# Altium footprint library Package_DFN_QFN.PcbLib: 557 footprints (part 15 of 35)
Each footprint in its own frame and in the unit in brackets; x right, y up, seen from the top. Pads: shape width x height; smd on the part's side, far side on the other; paste and mask are expansions set on the pad; w line width, h text height; cw(c..) or ccw(c..) is an arc to the next point about the centre after c.
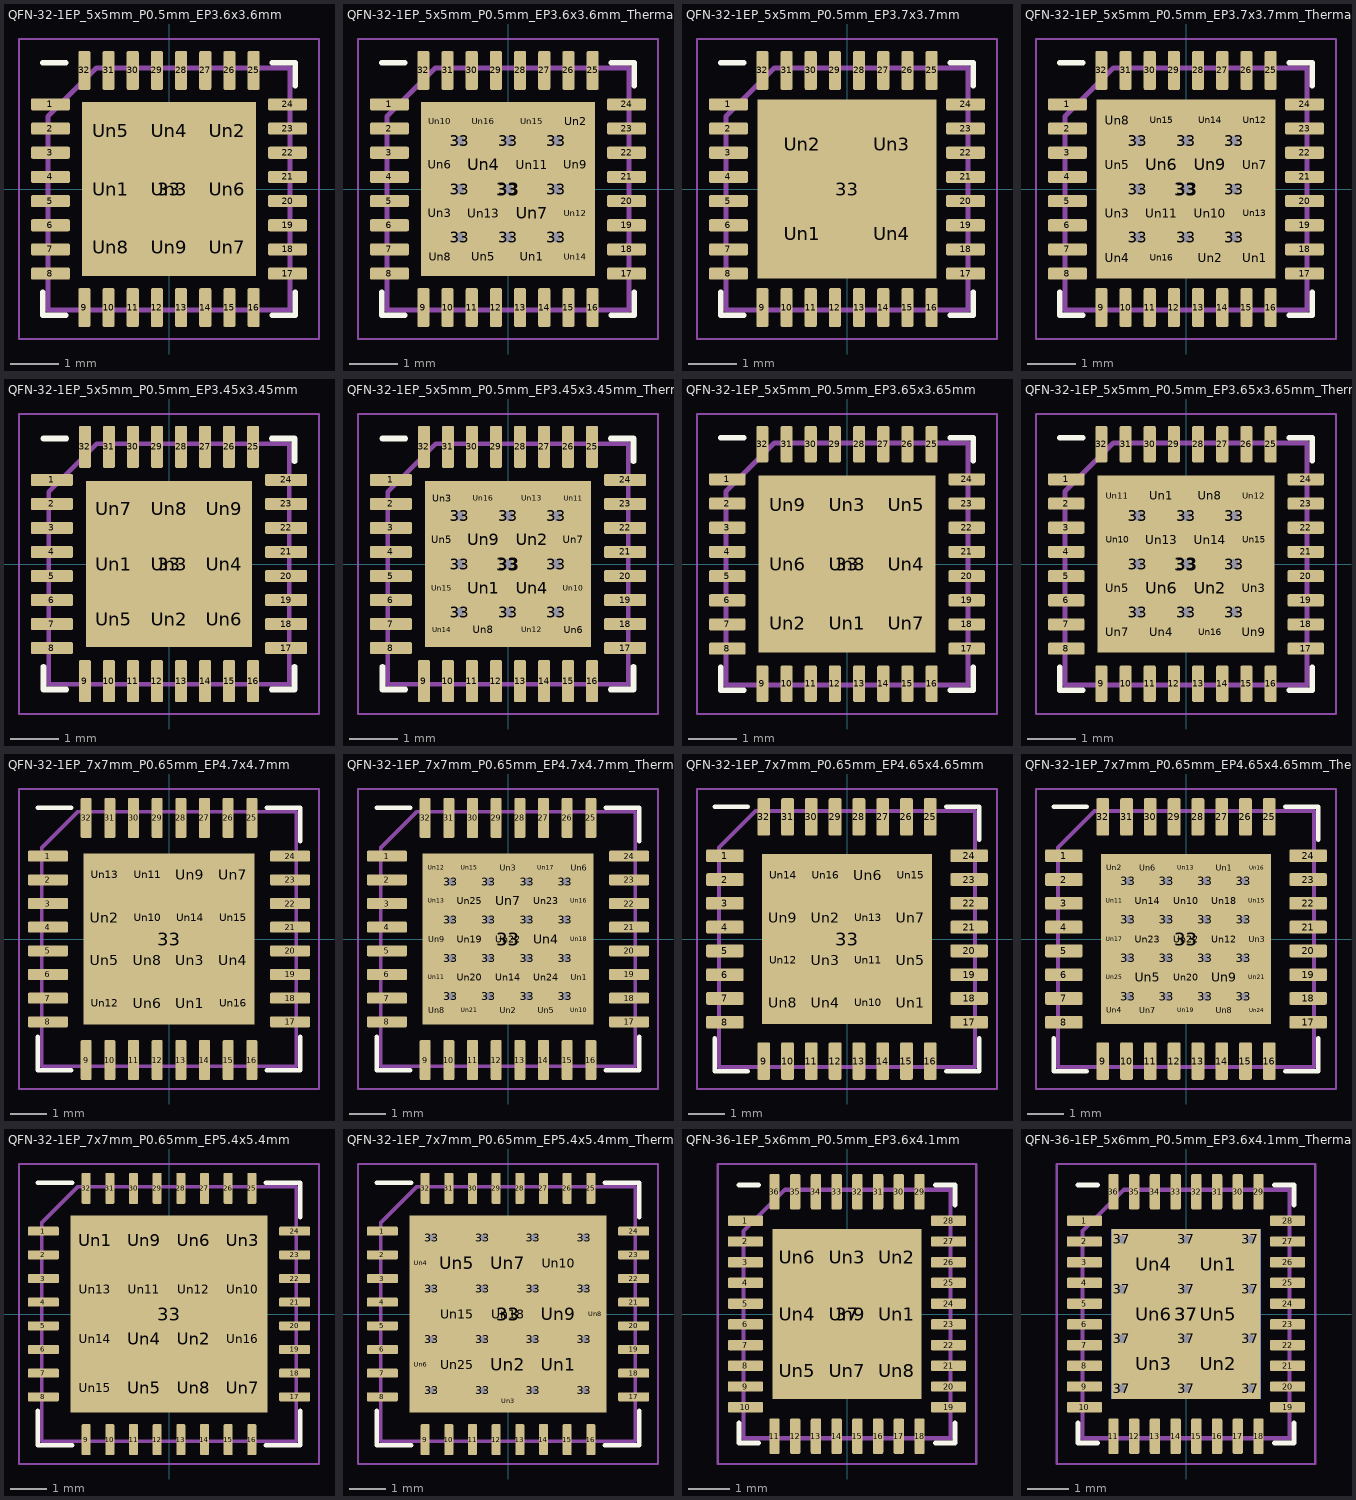
[diagram p14: the footprints below, top view; thin cyan lines are the x and y axes]

## QFN-32-1EP_5x5mm_P0.5mm_EP3.6x3.6mm [mm]
pads (42):
  rrect25% 0.8x0.25 smd: 1(-2.45,1.75) 2(-2.45,1.25) 3(-2.45,0.75) 4(-2.45,0.25) 5(-2.45,-0.25) 6(-2.45,-0.75) 7(-2.45,-1.25) 8(-2.45,-1.75) 17(2.45,-1.75) 18(2.45,-1.25) 19(2.45,-0.75) 20(2.45,-0.25) 21(2.45,0.25) 22(2.45,0.75) 23(2.45,1.25) 24(2.45,1.75)
  rrect25% 0.25x0.8 smd: 9(-1.75,-2.45) 10(-1.25,-2.45) 11(-0.75,-2.45) 12(-0.25,-2.45) 13(0.25,-2.45) 14(0.75,-2.45) 15(1.25,-2.45) 16(1.75,-2.45) 25(1.75,2.45) 26(1.25,2.45) 27(0.75,2.45) 28(0.25,2.45) 29(-0.25,2.45) 30(-0.75,2.45) 31(-1.25,2.45) 32(-1.75,2.45)
  rect 3.6x3.6 smd: 33(0,0)
  rrect25% 0.97x0.97 on Top Paste: Un1(-1.2,0) Un2(1.2,1.2) Un3(0,0) Un4(0,1.2) Un5(-1.2,1.2) Un6(1.2,0) Un7(1.2,-1.2) Un8(-1.2,-1.2) Un9(0,-1.2)
F.SilkS:
  lines w0.12: -2.61,-2.135 -2.61,-2.61 -2.135,-2.61 ; -2.61,2.61 -2.135,2.61 ; 2.135,-2.61 2.61,-2.61 2.61,-2.135 ; 2.135,2.61 2.61,2.61 2.61,2.135
F.CrtYd:
  lines w0.05: -3.1,-3.1 3.1,-3.1 3.1,3.1 -3.1,3.1 -3.1,-3.1
F.Fab:
  lines w0.1: -2.5,-2.5 2.5,-2.5 2.5,2.5 -1.5,2.5 -2.5,1.5 -2.5,-2.5
  text "'.Designator'" at -4.047,-0.84 h1

## QFN-32-1EP_5x5mm_P0.5mm_EP3.6x3.6mm_ThermalVias [mm]
pads (59):
  rrect25% 0.8x0.25 smd: 1(-2.45,1.75) 2(-2.45,1.25) 3(-2.45,0.75) 4(-2.45,0.25) 5(-2.45,-0.25) 6(-2.45,-0.75) 7(-2.45,-1.25) 8(-2.45,-1.75) 17(2.45,-1.75) 18(2.45,-1.25) 19(2.45,-0.75) 20(2.45,-0.25) 21(2.45,0.25) 22(2.45,0.75) 23(2.45,1.25) 24(2.45,1.75)
  rrect25% 0.25x0.8 smd: 9(-1.75,-2.45) 10(-1.25,-2.45) 11(-0.75,-2.45) 12(-0.25,-2.45) 13(0.25,-2.45) 14(0.75,-2.45) 15(1.25,-2.45) 16(1.75,-2.45) 25(1.75,2.45) 26(1.25,2.45) 27(0.75,2.45) 28(0.25,2.45) 29(-0.25,2.45) 30(-0.75,2.45) 31(-1.25,2.45) 32(-1.75,2.45)
  round 0.5 hole 0.2: 33(-1,-1) 33(-1,0) 33(-1,1) 33(0,-1) 33(0,0) 33(0,1) 33(1,-1) 33(1,0) 33(1,1)
  rect 3.6x3.6 smd: 33(0,0)
  rect 2.5x2.5 smd far side: 33(0,0)
  round 0.568 on Top Paste: Un1(0.5,-1.4) Un3(-1.4,-0.5) Un5(-0.5,-1.4) Un6(-1.4,0.5) Un9(1.4,0.5) Un12(1.4,-0.5) Un15(0.5,1.4) Un16(-0.5,1.4)
  round 0.555 on Top Paste: Un2(1.4,1.4) Un8(-1.4,-1.4) Un10(-1.4,1.4) Un14(1.4,-1.4)
  rrect25% 0.806x0.806 on Top Paste: Un4(-0.5,0.5) Un7(0.5,-0.5) Un11(0.5,0.5) Un13(-0.5,-0.5)
F.SilkS:
  lines w0.12: -2.61,-2.135 -2.61,-2.61 -2.135,-2.61 ; -2.61,2.61 -2.135,2.61 ; 2.135,-2.61 2.61,-2.61 2.61,-2.135 ; 2.135,2.61 2.61,2.61 2.61,2.135
F.Paste:
  region: 0.826,-1.218 0.826,-1.646 0.174,-1.646 0.174,-1.218 0.237,-1.154 0.763,-1.154
  region: 1.632,1.168 1.243,1.168 1.168,1.243 1.168,1.632 1.632,1.632
  region: -1.154,-0.237 -1.154,-0.763 -1.218,-0.826 -1.646,-0.826 -1.646,-0.174 -1.218,-0.174
  region: -0.174,-1.218 -0.174,-1.646 -0.826,-1.646 -0.826,-1.218 -0.763,-1.154 -0.237,-1.154
  region: -1.154,0.763 -1.154,0.237 -1.218,0.174 -1.646,0.174 -1.646,0.826 -1.218,0.826
  region: -1.168,-1.243 -1.168,-1.632 -1.632,-1.632 -1.632,-1.168 -1.243,-1.168
  region: 1.646,0.174 1.218,0.174 1.154,0.237 1.154,0.763 1.218,0.826 1.646,0.826
  region: -1.168,1.243 -1.243,1.168 -1.632,1.168 -1.632,1.632 -1.168,1.632
  region: 1.646,-0.826 1.218,-0.826 1.154,-0.763 1.154,-0.237 1.218,-0.174 1.646,-0.174
  region: 1.632,-1.632 1.168,-1.632 1.168,-1.243 1.243,-1.168 1.632,-1.168
  region: 0.826,1.218 0.763,1.154 0.237,1.154 0.174,1.218 0.174,1.646 0.826,1.646
  region: -0.174,1.218 -0.237,1.154 -0.763,1.154 -0.826,1.218 -0.826,1.646 -0.174,1.646
F.CrtYd:
  lines w0.05: -3.1,-3.1 3.1,-3.1 3.1,3.1 -3.1,3.1 -3.1,-3.1
F.Fab:
  lines w0.1: -2.5,-2.5 2.5,-2.5 2.5,2.5 -1.5,2.5 -2.5,1.5 -2.5,-2.5
  text "'.Designator'" at -4.047,-0.84 h1

## QFN-32-1EP_5x5mm_P0.5mm_EP3.7x3.7mm [mm]
pads (37):
  rrect25% 0.8x0.25 smd: 1(-2.45,1.75) 2(-2.45,1.25) 3(-2.45,0.75) 4(-2.45,0.25) 5(-2.45,-0.25) 6(-2.45,-0.75) 7(-2.45,-1.25) 8(-2.45,-1.75) 17(2.45,-1.75) 18(2.45,-1.25) 19(2.45,-0.75) 20(2.45,-0.25) 21(2.45,0.25) 22(2.45,0.75) 23(2.45,1.25) 24(2.45,1.75)
  rrect25% 0.25x0.8 smd: 9(-1.75,-2.45) 10(-1.25,-2.45) 11(-0.75,-2.45) 12(-0.25,-2.45) 13(0.25,-2.45) 14(0.75,-2.45) 15(1.25,-2.45) 16(1.75,-2.45) 25(1.75,2.45) 26(1.25,2.45) 27(0.75,2.45) 28(0.25,2.45) 29(-0.25,2.45) 30(-0.75,2.45) 31(-1.25,2.45) 32(-1.75,2.45)
  rect 3.7x3.7 smd: 33(0,0)
  rrect17% 1.49x1.49 on Top Paste: Un1(-0.925,-0.925) Un2(-0.925,0.925) Un3(0.925,0.925) Un4(0.925,-0.925)
F.SilkS:
  lines w0.12: -2.61,-2.135 -2.61,-2.61 -2.135,-2.61 ; -2.61,2.61 -2.135,2.61 ; 2.135,-2.61 2.61,-2.61 2.61,-2.135 ; 2.135,2.61 2.61,2.61 2.61,2.135
F.CrtYd:
  lines w0.05: -3.1,-3.1 -3.1,3.1 3.1,3.1 3.1,-3.1 -3.1,-3.1
F.Fab:
  lines w0.1: -2.5,-2.5 2.5,-2.5 2.5,2.5 -1.5,2.5 -2.5,1.5 -2.5,-2.5
  text "'.Designator'" at -4.047,-0.84 h1

## QFN-32-1EP_5x5mm_P0.5mm_EP3.7x3.7mm_ThermalVias [mm]
pads (59):
  rrect25% 0.8x0.25 smd: 1(-2.45,1.75) 2(-2.45,1.25) 3(-2.45,0.75) 4(-2.45,0.25) 5(-2.45,-0.25) 6(-2.45,-0.75) 7(-2.45,-1.25) 8(-2.45,-1.75) 17(2.45,-1.75) 18(2.45,-1.25) 19(2.45,-0.75) 20(2.45,-0.25) 21(2.45,0.25) 22(2.45,0.75) 23(2.45,1.25) 24(2.45,1.75)
  rrect25% 0.25x0.8 smd: 9(-1.75,-2.45) 10(-1.25,-2.45) 11(-0.75,-2.45) 12(-0.25,-2.45) 13(0.25,-2.45) 14(0.75,-2.45) 15(1.25,-2.45) 16(1.75,-2.45) 25(1.75,2.45) 26(1.25,2.45) 27(0.75,2.45) 28(0.25,2.45) 29(-0.25,2.45) 30(-0.75,2.45) 31(-1.25,2.45) 32(-1.75,2.45)
  round 0.5 hole 0.2: 33(-1,-1) 33(-1,0) 33(-1,1) 33(0,-1) 33(0,0) 33(0,1) 33(1,-1) 33(1,0) 33(1,1)
  rect 3.7x3.7 smd: 33(0,0)
  rect 2.5x2.5 smd far side: 33(0,0)
  round 0.602 on Top Paste: Un1(1.425,-1.425) Un4(-1.425,-1.425) Un8(-1.425,1.425) Un12(1.425,1.425)
  round 0.612 on Top Paste: Un2(0.5,-1.425) Un3(-1.425,-0.5) Un5(-1.425,0.5) Un7(1.425,0.5) Un13(1.425,-0.5) Un14(0.5,1.425) Un15(-0.5,1.425) Un16(-0.5,-1.425)
  rrect25% 0.806x0.806 on Top Paste: Un6(-0.5,0.5) Un9(0.5,0.5) Un10(0.5,-0.5) Un11(-0.5,-0.5)
F.SilkS:
  lines w0.12: -2.61,-2.135 -2.61,-2.61 -2.135,-2.61 ; -2.61,2.61 -2.135,2.61 ; 2.135,-2.61 2.61,-2.61 2.61,-2.135 ; 2.135,2.61 2.61,2.61 2.61,2.135
F.Paste:
  region: 1.684,-1.684 1.166,-1.684 1.166,-1.235 1.235,-1.166 1.684,-1.166
  region: 0.83,-1.216 0.83,-1.694 0.17,-1.694 0.17,-1.216 0.231,-1.156 0.769,-1.156
  region: -1.156,-0.231 -1.156,-0.769 -1.216,-0.83 -1.694,-0.83 -1.694,-0.17 -1.216,-0.17
  region: -1.166,-1.235 -1.166,-1.684 -1.684,-1.684 -1.684,-1.166 -1.235,-1.166
  region: -1.156,0.769 -1.156,0.231 -1.216,0.17 -1.694,0.17 -1.694,0.83 -1.216,0.83
  region: 1.694,0.17 1.216,0.17 1.156,0.231 1.156,0.769 1.216,0.83 1.694,0.83
  region: -1.166,1.235 -1.235,1.166 -1.684,1.166 -1.684,1.684 -1.166,1.684
  region: 1.684,1.166 1.235,1.166 1.166,1.235 1.166,1.684 1.684,1.684
  region: 1.694,-0.83 1.216,-0.83 1.156,-0.769 1.156,-0.231 1.216,-0.17 1.694,-0.17
  region: 0.83,1.216 0.769,1.156 0.231,1.156 0.17,1.216 0.17,1.694 0.83,1.694
  region: -0.17,1.216 -0.231,1.156 -0.769,1.156 -0.83,1.216 -0.83,1.694 -0.17,1.694
  region: -0.17,-1.216 -0.17,-1.694 -0.83,-1.694 -0.83,-1.216 -0.769,-1.156 -0.231,-1.156
F.CrtYd:
  lines w0.05: -3.1,-3.1 3.1,-3.1 3.1,3.1 -3.1,3.1 -3.1,-3.1
F.Fab:
  lines w0.1: -2.5,-2.5 -2.5,1.5 -1.5,2.5 2.5,2.5 2.5,-2.5 -2.5,-2.5
  text "'.Designator'" at -4.047,-0.84 h1

## QFN-32-1EP_5x5mm_P0.5mm_EP3.45x3.45mm [mm]
pads (42):
  rrect25% 0.875x0.25 smd: 1(-2.438,1.75) 2(-2.438,1.25) 3(-2.438,0.75) 4(-2.438,0.25) 5(-2.438,-0.25) 6(-2.438,-0.75) 7(-2.438,-1.25) 8(-2.438,-1.75) 17(2.438,-1.75) 18(2.438,-1.25) 19(2.438,-0.75) 20(2.438,-0.25) 21(2.438,0.25) 22(2.438,0.75) 23(2.438,1.25) 24(2.438,1.75)
  rrect25% 0.25x0.875 smd: 9(-1.75,-2.438) 10(-1.25,-2.438) 11(-0.75,-2.438) 12(-0.25,-2.438) 13(0.25,-2.438) 14(0.75,-2.438) 15(1.25,-2.438) 16(1.75,-2.438) 25(1.75,2.438) 26(1.25,2.438) 27(0.75,2.438) 28(0.25,2.438) 29(-0.25,2.438) 30(-0.75,2.438) 31(-1.25,2.438) 32(-1.75,2.438)
  rect 3.45x3.45 smd: 33(0,0)
  rrect25% 0.93x0.93 on Top Paste: Un1(-1.15,0) Un2(0,-1.15) Un3(0,0) Un4(1.15,0) Un5(-1.15,-1.15) Un6(1.15,-1.15) Un7(-1.15,1.15) Un8(0,1.15) Un9(1.15,1.15)
F.SilkS:
  lines w0.12: -2.61,-2.135 -2.61,-2.61 -2.135,-2.61 ; -2.61,2.61 -2.135,2.61 ; 2.135,-2.61 2.61,-2.61 2.61,-2.135 ; 2.135,2.61 2.61,2.61 2.61,2.135
F.CrtYd:
  lines w0.05: -3.12,-3.12 3.12,-3.12 3.12,3.12 -3.12,3.12 -3.12,-3.12
F.Fab:
  lines w0.1: -2.5,-2.5 2.5,-2.5 2.5,2.5 -1.5,2.5 -2.5,1.5 -2.5,-2.5
  text "'.Designator'" at -4.047,-0.84 h1

## QFN-32-1EP_5x5mm_P0.5mm_EP3.45x3.45mm_ThermalVias [mm]
pads (59):
  rrect25% 0.875x0.25 smd: 1(-2.438,1.75) 2(-2.438,1.25) 3(-2.438,0.75) 4(-2.438,0.25) 5(-2.438,-0.25) 6(-2.438,-0.75) 7(-2.438,-1.25) 8(-2.438,-1.75) 17(2.438,-1.75) 18(2.438,-1.25) 19(2.438,-0.75) 20(2.438,-0.25) 21(2.438,0.25) 22(2.438,0.75) 23(2.438,1.25) 24(2.438,1.75)
  rrect25% 0.25x0.875 smd: 9(-1.75,-2.438) 10(-1.25,-2.438) 11(-0.75,-2.438) 12(-0.25,-2.438) 13(0.25,-2.438) 14(0.75,-2.438) 15(1.25,-2.438) 16(1.75,-2.438) 25(1.75,2.438) 26(1.25,2.438) 27(0.75,2.438) 28(0.25,2.438) 29(-0.25,2.438) 30(-0.75,2.438) 31(-1.25,2.438) 32(-1.75,2.438)
  round 0.5 hole 0.2: 33(-1,-1) 33(-1,0) 33(-1,1) 33(0,-1) 33(0,0) 33(0,1) 33(1,-1) 33(1,0) 33(1,1)
  rect 3.45x3.45 smd: 33(0,0)
  rect 2.5x2.5 smd far side: 33(0,0)
  rrect25% 0.806x0.806 on Top Paste: Un1(-0.5,-0.5) Un2(0.5,0.5) Un4(0.5,-0.5) Un9(-0.5,0.5)
  round 0.484 on Top Paste: Un3(-1.362,1.362) Un6(1.362,-1.362) Un11(1.362,1.362) Un14(-1.362,-1.362)
  round 0.503 on Top Paste: Un5(-1.362,0.5) Un7(1.362,0.5) Un8(-0.5,-1.362) Un10(1.362,-0.5) Un12(0.5,-1.362) Un13(0.5,1.362) Un15(-1.362,-0.5) Un16(-0.5,1.362)
F.SilkS:
  lines w0.12: -2.61,-2.135 -2.61,-2.61 -2.135,-2.61 ; -2.61,2.61 -2.135,2.61 ; 2.135,-2.61 2.61,-2.61 2.61,-2.135 ; 2.135,2.61 2.61,2.61 2.61,2.135
F.Paste:
  region: -1.171,1.254 -1.254,1.171 -1.554,1.171 -1.554,1.554 -1.171,1.554
  region: -1.152,0.754 -1.152,0.246 -1.22,0.179 -1.573,0.179 -1.573,0.821 -1.22,0.821
  region: 1.554,-1.554 1.171,-1.554 1.171,-1.254 1.254,-1.171 1.554,-1.171
  region: 1.573,0.179 1.22,0.179 1.152,0.246 1.152,0.754 1.22,0.821 1.573,0.821
  region: -0.179,-1.22 -0.179,-1.573 -0.821,-1.573 -0.821,-1.22 -0.754,-1.152 -0.246,-1.152
  region: 1.573,-0.821 1.22,-0.821 1.152,-0.754 1.152,-0.246 1.22,-0.179 1.573,-0.179
  region: 1.554,1.171 1.254,1.171 1.171,1.254 1.171,1.554 1.554,1.554
  region: 0.821,-1.22 0.821,-1.573 0.179,-1.573 0.179,-1.22 0.246,-1.152 0.754,-1.152
  region: 0.821,1.22 0.754,1.152 0.246,1.152 0.179,1.22 0.179,1.573 0.821,1.573
  region: -1.171,-1.254 -1.171,-1.554 -1.554,-1.554 -1.554,-1.171 -1.254,-1.171
  region: -1.152,-0.246 -1.152,-0.754 -1.22,-0.821 -1.573,-0.821 -1.573,-0.179 -1.22,-0.179
  region: -0.179,1.22 -0.246,1.152 -0.754,1.152 -0.821,1.22 -0.821,1.573 -0.179,1.573
F.CrtYd:
  lines w0.05: -3.12,-3.12 3.12,-3.12 3.12,3.12 -3.12,3.12 -3.12,-3.12
F.Fab:
  lines w0.1: -2.5,-2.5 2.5,-2.5 2.5,2.5 -1.5,2.5 -2.5,1.5 -2.5,-2.5
  text "'.Designator'" at -4.047,-0.84 h1

## QFN-32-1EP_5x5mm_P0.5mm_EP3.65x3.65mm [mm]
pads (42):
  rrect25% 0.75x0.25 smd: 1(-2.475,1.75) 2(-2.475,1.25) 3(-2.475,0.75) 4(-2.475,0.25) 5(-2.475,-0.25) 6(-2.475,-0.75) 7(-2.475,-1.25) 8(-2.475,-1.75) 17(2.475,-1.75) 18(2.475,-1.25) 19(2.475,-0.75) 20(2.475,-0.25) 21(2.475,0.25) 22(2.475,0.75) 23(2.475,1.25) 24(2.475,1.75)
  rrect25% 0.25x0.75 smd: 9(-1.75,-2.475) 10(-1.25,-2.475) 11(-0.75,-2.475) 12(-0.25,-2.475) 13(0.25,-2.475) 14(0.75,-2.475) 15(1.25,-2.475) 16(1.75,-2.475) 25(1.75,2.475) 26(1.25,2.475) 27(0.75,2.475) 28(0.25,2.475) 29(-0.25,2.475) 30(-0.75,2.475) 31(-1.25,2.475) 32(-1.75,2.475)
  rect 3.65x3.65 smd: 33(0,0)
  rrect25% 0.98x0.98 on Top Paste: Un1(0,-1.22) Un2(-1.22,-1.22) Un3(0,1.22) Un4(1.22,0) Un5(1.22,1.22) Un6(-1.22,0) Un7(1.22,-1.22) Un8(0,0) Un9(-1.22,1.22)
F.SilkS:
  lines w0.12: -2.61,-2.135 -2.61,-2.61 -2.135,-2.61 ; -2.61,2.61 -2.135,2.61 ; 2.135,-2.61 2.61,-2.61 2.61,-2.135 ; 2.135,2.61 2.61,2.61 2.61,2.135
F.CrtYd:
  lines w0.05: -3.1,-3.1 -3.1,3.1 3.1,3.1 3.1,-3.1 -3.1,-3.1
F.Fab:
  lines w0.1: -2.5,-2.5 2.5,-2.5 2.5,2.5 -1.5,2.5 -2.5,1.5 -2.5,-2.5
  text "'.Designator'" at -4.047,-0.84 h1

## QFN-32-1EP_5x5mm_P0.5mm_EP3.65x3.65mm_ThermalVias [mm]
pads (59):
  rrect25% 0.75x0.25 smd: 1(-2.475,1.75) 2(-2.475,1.25) 3(-2.475,0.75) 4(-2.475,0.25) 5(-2.475,-0.25) 6(-2.475,-0.75) 7(-2.475,-1.25) 8(-2.475,-1.75) 17(2.475,-1.75) 18(2.475,-1.25) 19(2.475,-0.75) 20(2.475,-0.25) 21(2.475,0.25) 22(2.475,0.75) 23(2.475,1.25) 24(2.475,1.75)
  rrect25% 0.25x0.75 smd: 9(-1.75,-2.475) 10(-1.25,-2.475) 11(-0.75,-2.475) 12(-0.25,-2.475) 13(0.25,-2.475) 14(0.75,-2.475) 15(1.25,-2.475) 16(1.75,-2.475) 25(1.75,2.475) 26(1.25,2.475) 27(0.75,2.475) 28(0.25,2.475) 29(-0.25,2.475) 30(-0.75,2.475) 31(-1.25,2.475) 32(-1.75,2.475)
  round 0.5 hole 0.2: 33(-1,-1) 33(-1,0) 33(-1,1) 33(0,-1) 33(0,0) 33(0,1) 33(1,-1) 33(1,0) 33(1,1)
  rect 3.65x3.65 smd: 33(0,0)
  rect 2.5x2.5 smd far side: 33(0,0)
  round 0.59 on Top Paste: Un1(-0.5,1.412) Un3(1.412,-0.5) Un4(-0.5,-1.412) Un5(-1.412,-0.5) Un8(0.5,1.412) Un10(-1.412,0.5) Un15(1.412,0.5) Un16(0.5,-1.412)
  rrect25% 0.806x0.806 on Top Paste: Un2(0.5,-0.5) Un6(-0.5,-0.5) Un13(-0.5,0.5) Un14(0.5,0.5)
  round 0.578 on Top Paste: Un7(-1.412,-1.412) Un9(1.412,-1.412) Un11(-1.412,1.412) Un12(1.412,1.412)
F.SilkS:
  lines w0.12: -2.61,-2.135 -2.61,-2.61 -2.135,-2.61 ; -2.61,2.61 -2.135,2.61 ; 2.135,-2.61 2.61,-2.61 2.61,-2.135 ; 2.135,2.61 2.61,2.61 2.61,2.135
F.Paste:
  region: -0.172,1.217 -0.234,1.155 -0.766,1.155 -0.828,1.217 -0.828,1.67 -0.172,1.67
  region: 1.67,-0.828 1.217,-0.828 1.155,-0.766 1.155,-0.234 1.217,-0.172 1.67,-0.172
  region: -0.172,-1.217 -0.172,-1.67 -0.828,-1.67 -0.828,-1.217 -0.766,-1.155 -0.234,-1.155
  region: -1.155,-0.234 -1.155,-0.766 -1.217,-0.828 -1.67,-0.828 -1.67,-0.172 -1.217,-0.172
  region: -1.167,-1.239 -1.167,-1.658 -1.658,-1.658 -1.658,-1.167 -1.239,-1.167
  region: 0.828,1.217 0.766,1.155 0.234,1.155 0.172,1.217 0.172,1.67 0.828,1.67
  region: 1.658,-1.658 1.167,-1.658 1.167,-1.239 1.239,-1.167 1.658,-1.167
  region: -1.155,0.766 -1.155,0.234 -1.217,0.172 -1.67,0.172 -1.67,0.828 -1.217,0.828
  region: -1.167,1.239 -1.239,1.167 -1.658,1.167 -1.658,1.658 -1.167,1.658
  region: 1.658,1.167 1.239,1.167 1.167,1.239 1.167,1.658 1.658,1.658
  region: 1.67,0.172 1.217,0.172 1.155,0.234 1.155,0.766 1.217,0.828 1.67,0.828
  region: 0.828,-1.217 0.828,-1.67 0.172,-1.67 0.172,-1.217 0.234,-1.155 0.766,-1.155
F.CrtYd:
  lines w0.05: -3.1,-3.1 -3.1,3.1 3.1,3.1 3.1,-3.1 -3.1,-3.1
F.Fab:
  lines w0.1: -2.5,-2.5 2.5,-2.5 2.5,2.5 -1.5,2.5 -2.5,1.5 -2.5,-2.5
  text "'.Designator'" at -4.047,-0.84 h1

## QFN-32-1EP_7x7mm_P0.65mm_EP4.7x4.7mm [mm]
pads (49):
  rrect25% 1.1x0.3 smd: 1(-3.325,2.275) 2(-3.325,1.625) 3(-3.325,0.975) 4(-3.325,0.325) 5(-3.325,-0.325) 6(-3.325,-0.975) 7(-3.325,-1.625) 8(-3.325,-2.275) 17(3.325,-2.275) 18(3.325,-1.625) 19(3.325,-0.975) 20(3.325,-0.325) 21(3.325,0.325) 22(3.325,0.975) 23(3.325,1.625) 24(3.325,2.275)
  rrect25% 0.3x1.1 smd: 9(-2.275,-3.325) 10(-1.625,-3.325) 11(-0.975,-3.325) 12(-0.325,-3.325) 13(0.325,-3.325) 14(0.975,-3.325) 15(1.625,-3.325) 16(2.275,-3.325) 25(2.275,3.325) 26(1.625,3.325) 27(0.975,3.325) 28(0.325,3.325) 29(-0.325,3.325) 30(-0.975,3.325) 31(-1.625,3.325) 32(-2.275,3.325)
  rect 4.7x4.7 smd: 33(0,0)
  rrect25% 0.95x0.95 on Top Paste: Un1(0.59,-1.77) Un2(-1.77,0.59) Un3(0.59,-0.59) Un4(1.77,-0.59) Un5(-1.77,-0.59) Un6(-0.59,-1.77) Un7(1.77,1.77) Un8(-0.59,-0.59) Un9(0.59,1.77) Un10(-0.59,0.59) Un11(-0.59,1.77) Un12(-1.77,-1.77) Un13(-1.77,1.77) Un14(0.59,0.59) Un15(1.77,0.59) Un16(1.77,-1.77)
F.SilkS:
  lines w0.12: -3.61,-2.685 -3.61,-3.61 -2.685,-3.61 ; -3.61,3.61 -2.685,3.61 ; 2.685,-3.61 3.61,-3.61 3.61,-2.685 ; 2.685,3.61 3.61,3.61 3.61,2.685
F.CrtYd:
  lines w0.05: -4.12,-4.12 -4.12,4.12 4.12,4.12 4.12,-4.12 -4.12,-4.12
F.Fab:
  lines w0.1: -3.5,-3.5 3.5,-3.5 3.5,3.5 -2.5,3.5 -3.5,2.5 -3.5,-3.5
  text "'.Designator'" at -4.047,-0.84 h1

## QFN-32-1EP_7x7mm_P0.65mm_EP4.7x4.7mm_ThermalVias [mm]
pads (75):
  rrect25% 1.1x0.3 smd: 1(-3.325,2.275) 2(-3.325,1.625) 3(-3.325,0.975) 4(-3.325,0.325) 5(-3.325,-0.325) 6(-3.325,-0.975) 7(-3.325,-1.625) 8(-3.325,-2.275) 17(3.325,-2.275) 18(3.325,-1.625) 19(3.325,-0.975) 20(3.325,-0.325) 21(3.325,0.325) 22(3.325,0.975) 23(3.325,1.625) 24(3.325,2.275)
  rrect25% 0.3x1.1 smd: 9(-2.275,-3.325) 10(-1.625,-3.325) 11(-0.975,-3.325) 12(-0.325,-3.325) 13(0.325,-3.325) 14(0.975,-3.325) 15(1.625,-3.325) 16(2.275,-3.325) 25(2.275,3.325) 26(1.625,3.325) 27(0.975,3.325) 28(0.325,3.325) 29(-0.325,3.325) 30(-0.975,3.325) 31(-1.625,3.325) 32(-2.275,3.325)
  round 0.5 hole 0.2: 33(-1.575,-1.575) 33(-1.575,-0.525) 33(-1.575,0.525) 33(-1.575,1.575) 33(-0.525,-1.575) 33(-0.525,-0.525) 33(-0.525,0.525) 33(-0.525,1.575) 33(0.525,-1.575) 33(0.525,-0.525) 33(0.525,0.525) 33(0.525,1.575) 33(1.575,-1.575) 33(1.575,-0.525) 33(1.575,0.525) 33(1.575,1.575)
  rect 3.65x3.65 smd far side: 33(0,0)
  rect 4.7x4.7 smd: 33(0,0)
  round 0.55 on Top Paste: Un1(1.963,-1.05) Un2(0,-1.963) Un3(0,1.963) Un5(1.05,-1.963) Un9(-1.963,0) Un11(-1.963,-1.05) Un13(-1.963,1.05) Un15(-1.05,1.963) Un16(1.963,1.05) Un17(1.05,1.963) Un18(1.963,0) Un21(-1.05,-1.963)
  rrect25% 0.847x0.847 on Top Paste: Un4(1.05,0) Un7(0,1.05) Un14(0,-1.05) Un19(-1.05,0) Un20(-1.05,-1.05) Un22(0,0) Un23(1.05,1.05) Un24(1.05,-1.05) Un25(-1.05,1.05)
  round 0.531 on Top Paste: Un6(1.963,1.963) Un8(-1.963,-1.963) Un10(1.963,-1.963) Un12(-1.963,1.963)
F.SilkS:
  lines w0.12: -3.61,-2.685 -3.61,-3.61 -2.685,-3.61 ; -3.61,3.61 -2.685,3.61 ; 2.685,-3.61 3.61,-3.61 3.61,-2.685 ; 2.685,3.61 3.61,3.61 3.61,2.685
F.Paste:
  region: 2.2,-1.398 1.787,-1.398 1.725,-1.336 1.725,-0.764 1.787,-0.702 2.2,-0.702
  region: 0.348,-1.787 0.348,-2.2 -0.348,-2.2 -0.348,-1.787 -0.286,-1.725 0.286,-1.725
  region: 0.348,1.787 0.286,1.725 -0.286,1.725 -0.348,1.787 -0.348,2.2 0.348,2.2
  region: 1.398,-1.787 1.398,-2.2 0.702,-2.2 0.702,-1.787 0.764,-1.725 1.336,-1.725
  region: 2.181,1.744 1.822,1.744 1.744,1.822 1.744,2.181 2.181,2.181
  region: -1.744,-1.822 -1.744,-2.181 -2.181,-2.181 -2.181,-1.744 -1.822,-1.744
  region: -1.725,0.286 -1.725,-0.286 -1.787,-0.348 -2.2,-0.348 -2.2,0.348 -1.787,0.348
  region: 2.181,-2.181 1.744,-2.181 1.744,-1.822 1.822,-1.744 2.181,-1.744
  region: -1.725,-0.764 -1.725,-1.336 -1.787,-1.398 -2.2,-1.398 -2.2,-0.702 -1.787,-0.702
  region: -1.744,1.822 -1.822,1.744 -2.181,1.744 -2.181,2.181 -1.744,2.181
  region: -1.725,1.336 -1.725,0.764 -1.787,0.702 -2.2,0.702 -2.2,1.398 -1.787,1.398
  region: -0.702,1.787 -0.764,1.725 -1.336,1.725 -1.398,1.787 -1.398,2.2 -0.702,2.2
  region: 2.2,0.702 1.787,0.702 1.725,0.764 1.725,1.336 1.787,1.398 2.2,1.398
  region: 1.398,1.787 1.336,1.725 0.764,1.725 0.702,1.787 0.702,2.2 1.398,2.2
  region: 2.2,-0.348 1.787,-0.348 1.725,-0.286 1.725,0.286 1.787,0.348 2.2,0.348
  region: -0.702,-1.787 -0.702,-2.2 -1.398,-2.2 -1.398,-1.787 -1.336,-1.725 -0.764,-1.725
F.CrtYd:
  lines w0.05: -4.12,-4.12 -4.12,4.12 4.12,4.12 4.12,-4.12 -4.12,-4.12
F.Fab:
  lines w0.1: -3.5,-3.5 -3.5,2.5 -2.5,3.5 3.5,3.5 3.5,-3.5 -3.5,-3.5
  text "'.Designator'" at -4.047,-0.84 h1

## QFN-32-1EP_7x7mm_P0.65mm_EP4.65x4.65mm [mm]
pads (49):
  rrect25% 1.025x0.35 smd: 1(-3.337,2.275) 2(-3.337,1.625) 3(-3.337,0.975) 4(-3.337,0.325) 5(-3.337,-0.325) 6(-3.337,-0.975) 7(-3.337,-1.625) 8(-3.337,-2.275) 17(3.337,-2.275) 18(3.337,-1.625) 19(3.337,-0.975) 20(3.337,-0.325) 21(3.337,0.325) 22(3.337,0.975) 23(3.337,1.625) 24(3.337,2.275)
  rrect25% 0.35x1.025 smd: 9(-2.275,-3.337) 10(-1.625,-3.337) 11(-0.975,-3.337) 12(-0.325,-3.337) 13(0.325,-3.337) 14(0.975,-3.337) 15(1.625,-3.337) 16(2.275,-3.337) 25(2.275,3.337) 26(1.625,3.337) 27(0.975,3.337) 28(0.325,3.337) 29(-0.325,3.337) 30(-0.975,3.337) 31(-1.625,3.337) 32(-2.275,3.337)
  rect 4.65x4.65 smd: 33(0,0)
  rrect25% 0.94x0.94 on Top Paste: Un1(1.74,-1.74) Un2(-0.58,0.58) Un3(-0.58,-0.58) Un4(-0.58,-1.74) Un5(1.74,-0.58) Un6(0.58,1.74) Un7(1.74,0.58) Un8(-1.74,-1.74) Un9(-1.74,0.58) Un10(0.58,-1.74) Un11(0.58,-0.58) Un12(-1.74,-0.58) Un13(0.58,0.58) Un14(-1.74,1.74) Un15(1.74,1.74) Un16(-0.58,1.74)
F.SilkS:
  lines w0.12: -3.61,-2.71 -3.61,-3.61 -2.71,-3.61 ; -3.61,3.61 -2.71,3.61 ; 2.71,-3.61 3.61,-3.61 3.61,-2.71 ; 2.71,3.61 3.61,3.61 3.61,2.71
F.CrtYd:
  lines w0.05: -4.1,-4.1 -4.1,4.1 4.1,4.1 4.1,-4.1 -4.1,-4.1
F.Fab:
  lines w0.1: -3.5,-3.5 3.5,-3.5 3.5,3.5 -2.5,3.5 -3.5,2.5 -3.5,-3.5
  text "'.Designator'" at -4.047,-0.84 h1

## QFN-32-1EP_7x7mm_P0.65mm_EP4.65x4.65mm_ThermalVias [mm]
pads (75):
  rrect25% 1.025x0.35 smd: 1(-3.337,2.275) 2(-3.337,1.625) 3(-3.337,0.975) 4(-3.337,0.325) 5(-3.337,-0.325) 6(-3.337,-0.975) 7(-3.337,-1.625) 8(-3.337,-2.275) 17(3.337,-2.275) 18(3.337,-1.625) 19(3.337,-0.975) 20(3.337,-0.325) 21(3.337,0.325) 22(3.337,0.975) 23(3.337,1.625) 24(3.337,2.275)
  rrect25% 0.35x1.025 smd: 9(-2.275,-3.337) 10(-1.625,-3.337) 11(-0.975,-3.337) 12(-0.325,-3.337) 13(0.325,-3.337) 14(0.975,-3.337) 15(1.625,-3.337) 16(2.275,-3.337) 25(2.275,3.337) 26(1.625,3.337) 27(0.975,3.337) 28(0.325,3.337) 29(-0.325,3.337) 30(-0.975,3.337) 31(-1.625,3.337) 32(-2.275,3.337)
  round 0.5 hole 0.2: 33(-1.575,-1.575) 33(-1.575,-0.525) 33(-1.575,0.525) 33(-1.575,1.575) 33(-0.525,-1.575) 33(-0.525,-0.525) 33(-0.525,0.525) 33(-0.525,1.575) 33(0.525,-1.575) 33(0.525,-0.525) 33(0.525,0.525) 33(0.525,1.575) 33(1.575,-1.575) 33(1.575,-0.525) 33(1.575,0.525) 33(1.575,1.575)
  rect 4.65x4.65 smd: 33(0,0)
  rect 3.65x3.65 smd far side: 33(0,0)
  round 0.528 on Top Paste: Un1(1.05,1.95) Un3(1.95,0) Un6(-1.05,1.95) Un7(-1.05,-1.95) Un8(1.05,-1.95) Un11(-1.95,1.05) Un13(0,1.95) Un15(1.95,1.05) Un17(-1.95,0) Un19(0,-1.95) Un21(1.95,-1.05) Un25(-1.95,-1.05)
  round 0.507 on Top Paste: Un2(-1.95,1.95) Un4(-1.95,-1.95) Un16(1.95,1.95) Un24(1.95,-1.95)
  rrect25% 0.847x0.847 on Top Paste: Un5(-1.05,-1.05) Un9(1.05,-1.05) Un10(0,1.05) Un12(1.05,0) Un14(-1.05,1.05) Un18(1.05,1.05) Un20(0,-1.05) Un22(0,0) Un23(-1.05,0)
F.SilkS:
  lines w0.12: -3.61,-2.71 -3.61,-3.61 -2.71,-3.61 ; -3.61,3.61 -2.71,3.61 ; 2.71,-3.61 3.61,-3.61 3.61,-2.71 ; 2.71,3.61 3.61,3.61 3.61,2.71
F.Paste:
  region: 1.397,1.788 1.333,1.724 0.767,1.724 0.703,1.788 0.703,2.176 1.397,2.176
  region: -1.745,1.825 -1.825,1.745 -2.155,1.745 -2.155,2.155 -1.745,2.155
  region: 2.176,-0.347 1.788,-0.347 1.724,-0.283 1.724,0.283 1.788,0.347 2.176,0.347
  region: -1.745,-1.825 -1.745,-2.155 -2.155,-2.155 -2.155,-1.745 -1.825,-1.745
  region: -0.703,1.788 -0.767,1.724 -1.333,1.724 -1.397,1.788 -1.397,2.176 -0.703,2.176
  region: -0.703,-1.788 -0.703,-2.176 -1.397,-2.176 -1.397,-1.788 -1.333,-1.724 -0.767,-1.724
  region: 1.397,-1.788 1.397,-2.176 0.703,-2.176 0.703,-1.788 0.767,-1.724 1.333,-1.724
  region: -1.724,1.333 -1.724,0.767 -1.788,0.703 -2.176,0.703 -2.176,1.397 -1.788,1.397
  region: 0.347,1.788 0.283,1.724 -0.283,1.724 -0.347,1.788 -0.347,2.176 0.347,2.176
  region: 2.176,0.703 1.788,0.703 1.724,0.767 1.724,1.333 1.788,1.397 2.176,1.397
  region: 2.155,1.745 1.825,1.745 1.745,1.825 1.745,2.155 2.155,2.155
  region: -1.724,0.283 -1.724,-0.283 -1.788,-0.347 -2.176,-0.347 -2.176,0.347 -1.788,0.347
  region: 0.347,-1.788 0.347,-2.176 -0.347,-2.176 -0.347,-1.788 -0.283,-1.724 0.283,-1.724
  region: 2.176,-1.397 1.788,-1.397 1.724,-1.333 1.724,-0.767 1.788,-0.703 2.176,-0.703
  region: 2.155,-2.155 1.745,-2.155 1.745,-1.825 1.825,-1.745 2.155,-1.745
  region: -1.724,-0.767 -1.724,-1.333 -1.788,-1.397 -2.176,-1.397 -2.176,-0.703 -1.788,-0.703
F.CrtYd:
  lines w0.05: -4.1,-4.1 -4.1,4.1 4.1,4.1 4.1,-4.1 -4.1,-4.1
F.Fab:
  lines w0.1: -3.5,-3.5 3.5,-3.5 3.5,3.5 -2.5,3.5 -3.5,2.5 -3.5,-3.5
  text "'.Designator'" at -4.047,-0.84 h1

## QFN-32-1EP_7x7mm_P0.65mm_EP5.4x5.4mm [mm]
pads (49):
  rrect25% 0.85x0.25 smd: 1(-3.45,2.275) 2(-3.45,1.625) 3(-3.45,0.975) 4(-3.45,0.325) 5(-3.45,-0.325) 6(-3.45,-0.975) 7(-3.45,-1.625) 8(-3.45,-2.275) 17(3.45,-2.275) 18(3.45,-1.625) 19(3.45,-0.975) 20(3.45,-0.325) 21(3.45,0.325) 22(3.45,0.975) 23(3.45,1.625) 24(3.45,2.275)
  rrect25% 0.25x0.85 smd: 9(-2.275,-3.45) 10(-1.625,-3.45) 11(-0.975,-3.45) 12(-0.325,-3.45) 13(0.325,-3.45) 14(0.975,-3.45) 15(1.625,-3.45) 16(2.275,-3.45) 25(2.275,3.45) 26(1.625,3.45) 27(0.975,3.45) 28(0.325,3.45) 29(-0.325,3.45) 30(-0.975,3.45) 31(-1.625,3.45) 32(-2.275,3.45)
  rect 5.4x5.4 smd: 33(0,0)
  rrect23% 1.09x1.09 on Top Paste: Un1(-2.025,2.025) Un2(0.675,-0.675) Un3(2.025,2.025) Un4(-0.675,-0.675) Un5(-0.675,-2.025) Un6(0.675,2.025) Un7(2.025,-2.025) Un8(0.675,-2.025) Un9(-0.675,2.025) Un10(2.025,0.675) Un11(-0.675,0.675) Un12(0.675,0.675) Un13(-2.025,0.675) Un14(-2.025,-0.675) Un15(-2.025,-2.025) Un16(2.025,-0.675)
F.SilkS:
  lines w0.12: -3.61,-2.66 -3.61,-3.61 -2.66,-3.61 ; -3.61,3.61 -2.66,3.61 ; 2.66,-3.61 3.61,-3.61 3.61,-2.66 ; 2.66,3.61 3.61,3.61 3.61,2.66
F.CrtYd:
  lines w0.05: -4.12,-4.12 -4.12,4.12 4.12,4.12 4.12,-4.12 -4.12,-4.12
F.Fab:
  lines w0.1: -3.5,-3.5 3.5,-3.5 3.5,3.5 -2.5,3.5 -3.5,2.5 -3.5,-3.5
  text "'.Designator'" at -4.047,-0.84 h1

## QFN-32-1EP_7x7mm_P0.65mm_EP5.4x5.4mm_ThermalVias [mm]
pads (75):
  rrect25% 0.85x0.25 smd: 1(-3.45,2.275) 2(-3.45,1.625) 3(-3.45,0.975) 4(-3.45,0.325) 5(-3.45,-0.325) 6(-3.45,-0.975) 7(-3.45,-1.625) 8(-3.45,-2.275) 17(3.45,-2.275) 18(3.45,-1.625) 19(3.45,-0.975) 20(3.45,-0.325) 21(3.45,0.325) 22(3.45,0.975) 23(3.45,1.625) 24(3.45,2.275)
  rrect25% 0.25x0.85 smd: 9(-2.275,-3.45) 10(-1.625,-3.45) 11(-0.975,-3.45) 12(-0.325,-3.45) 13(0.325,-3.45) 14(0.975,-3.45) 15(1.625,-3.45) 16(2.275,-3.45) 25(2.275,3.45) 26(1.625,3.45) 27(0.975,3.45) 28(0.325,3.45) 29(-0.325,3.45) 30(-0.975,3.45) 31(-1.625,3.45) 32(-2.275,3.45)
  round 0.5 hole 0.2: 33(-2.1,-2.1) 33(-2.1,-0.7) 33(-2.1,0.7) 33(-2.1,2.1) 33(-0.7,-2.1) 33(-0.7,-0.7) 33(-0.7,0.7) 33(-0.7,2.1) 33(0.7,-2.1) 33(0.7,-0.7) 33(0.7,0.7) 33(0.7,2.1) 33(2.1,-2.1) 33(2.1,-0.7) 33(2.1,0.7) 33(2.1,2.1)
  rect 5.4x5.4 smd: 33(0,0)
  rect 4.7x4.7 smd far side: 33(0,0)
  rrect22% 1.129x1.129 on Top Paste: Un1(1.4,-1.4) Un2(0,-1.4) Un5(-1.4,1.4) Un7(0,1.4) Un9(1.4,0) Un10(1.4,1.4) Un15(-1.4,0) Un18(0,0) Un25(-1.4,-1.4)
  round 0.421 on Top Paste: Un3(0,-2.4) Un4(-2.4,1.4) Un6(-2.4,-1.4) Un8(2.4,0) Un11(1.4,2.4) Un12(2.4,1.4) Un14(-1.4,2.4) Un16(2.4,-1.4) Un17(1.4,-2.4) Un20(-1.4,-2.4) Un21(0,2.4) Un24(-2.4,0)
  round 0.366 on Top Paste: Un13(-2.4,-2.4) Un19(-2.4,2.4) Un22(2.4,-2.4) Un23(2.4,2.4)
F.SilkS:
  lines w0.12: -3.61,-2.66 -3.61,-3.61 -2.66,-3.61 ; -3.61,3.61 -2.66,3.61 ; 2.66,-3.61 3.61,-3.61 3.61,-2.66 ; 2.66,3.61 3.61,3.61 3.61,2.66
F.Paste:
  region: 0.501,-2.273 0.501,-2.579 -0.501,-2.579 -0.501,-2.273 -0.449,-2.221 0.449,-2.221
  region: -2.221,1.849 -2.221,0.951 -2.273,0.899 -2.579,0.899 -2.579,1.901 -2.273,1.901
  region: -2.221,-0.951 -2.221,-1.849 -2.273,-1.901 -2.579,-1.901 -2.579,-0.899 -2.273,-0.899
  region: 2.579,-0.501 2.273,-0.501 2.221,-0.449 2.221,0.449 2.273,0.501 2.579,0.501
  region: 1.901,2.273 1.849,2.221 0.951,2.221 0.899,2.273 0.899,2.579 1.901,2.579
  region: 2.579,0.899 2.273,0.899 2.221,0.951 2.221,1.849 2.273,1.901 2.579,1.901
  region: -2.276,-2.374 -2.276,-2.524 -2.524,-2.524 -2.524,-2.276 -2.374,-2.276
  region: -0.899,2.273 -0.951,2.221 -1.849,2.221 -1.901,2.273 -1.901,2.579 -0.899,2.579
  region: 2.579,-1.901 2.273,-1.901 2.221,-1.849 2.221,-0.951 2.273,-0.899 2.579,-0.899
  region: 1.901,-2.273 1.901,-2.579 0.899,-2.579 0.899,-2.273 0.951,-2.221 1.849,-2.221
  region: -2.276,2.374 -2.374,2.276 -2.524,2.276 -2.524,2.524 -2.276,2.524
  region: -0.899,-2.273 -0.899,-2.579 -1.901,-2.579 -1.901,-2.273 -1.849,-2.221 -0.951,-2.221
  region: 0.501,2.273 0.449,2.221 -0.449,2.221 -0.501,2.273 -0.501,2.579 0.501,2.579
  region: 2.524,-2.524 2.276,-2.524 2.276,-2.374 2.374,-2.276 2.524,-2.276
  region: 2.524,2.276 2.374,2.276 2.276,2.374 2.276,2.524 2.524,2.524
  region: -2.221,0.449 -2.221,-0.449 -2.273,-0.501 -2.579,-0.501 -2.579,0.501 -2.273,0.501
F.CrtYd:
  lines w0.05: -4.12,-4.12 4.12,-4.12 4.12,4.12 -4.12,4.12 -4.12,-4.12
F.Fab:
  lines w0.1: -3.5,-3.5 3.5,-3.5 3.5,3.5 -2.5,3.5 -3.5,2.5 -3.5,-3.5
  text "'.Designator'" at -4.047,-0.84 h1

## QFN-36-1EP_5x6mm_P0.5mm_EP3.6x4.1mm [mm]
pads (46):
  rrect25% 0.85x0.25 smd: 1(-2.45,2.25) 2(-2.45,1.75) 3(-2.45,1.25) 4(-2.45,0.75) 5(-2.45,0.25) 6(-2.45,-0.25) 7(-2.45,-0.75) 8(-2.45,-1.25) 9(-2.45,-1.75) 10(-2.45,-2.25) 19(2.45,-2.25) 20(2.45,-1.75) 21(2.45,-1.25) 22(2.45,-0.75) 23(2.45,-0.25) 24(2.45,0.25) 25(2.45,0.75) 26(2.45,1.25) 27(2.45,1.75) 28(2.45,2.25)
  rrect25% 0.25x0.85 smd: 11(-1.75,-2.95) 12(-1.25,-2.95) 13(-0.75,-2.95) 14(-0.25,-2.95) 15(0.25,-2.95) 16(0.75,-2.95) 17(1.25,-2.95) 18(1.75,-2.95) 29(1.75,2.95) 30(1.25,2.95) 31(0.75,2.95) 32(0.25,2.95) 33(-0.25,2.95) 34(-0.75,2.95) 35(-1.25,2.95) 36(-1.75,2.95)
  rect 3.6x4.1 smd: 37(0,0)
  rrect25% 0.97x1.1 on Top Paste: Un1(1.2,0) Un2(1.2,1.37) Un3(0,1.37) Un4(-1.2,0) Un5(-1.2,-1.37) Un6(-1.2,1.37) Un7(0,-1.37) Un8(1.2,-1.37) Un9(0,0)
F.SilkS:
  lines w0.12: -2.61,-2.635 -2.61,-3.11 -2.135,-3.11 ; -2.61,3.11 -2.135,3.11 ; 2.135,-3.11 2.61,-3.11 2.61,-2.635 ; 2.135,3.11 2.61,3.11 2.61,2.635
F.CrtYd:
  lines w0.05: -3.12,-3.62 3.12,-3.62 3.12,3.62 -3.12,3.62 -3.12,-3.62
F.Fab:
  lines w0.1: -2.5,-3 -2.5,2 -1.5,3 2.5,3 2.5,-3 -2.5,-3
  text "'.Designator'" at -4.047,-0.84 h1

## QFN-36-1EP_5x6mm_P0.5mm_EP3.6x4.1mm_ThermalVias [mm]
pads (56):
  rrect25% 0.85x0.25 smd: 1(-2.45,2.25) 2(-2.45,1.75) 3(-2.45,1.25) 4(-2.45,0.75) 5(-2.45,0.25) 6(-2.45,-0.25) 7(-2.45,-0.75) 8(-2.45,-1.25) 9(-2.45,-1.75) 10(-2.45,-2.25) 19(2.45,-2.25) 20(2.45,-1.75) 21(2.45,-1.25) 22(2.45,-0.75) 23(2.45,-0.25) 24(2.45,0.25) 25(2.45,0.75) 26(2.45,1.25) 27(2.45,1.75) 28(2.45,2.25)
  rrect25% 0.25x0.85 smd: 11(-1.75,-2.95) 12(-1.25,-2.95) 13(-0.75,-2.95) 14(-0.25,-2.95) 15(0.25,-2.95) 16(0.75,-2.95) 17(1.25,-2.95) 18(1.75,-2.95) 29(1.75,2.95) 30(1.25,2.95) 31(0.75,2.95) 32(0.25,2.95) 33(-0.25,2.95) 34(-0.75,2.95) 35(-1.25,2.95) 36(-1.75,2.95)
  round 0.5 hole 0.2: 37(-1.55,-1.8) 37(-1.55,-0.6) 37(-1.55,0.6) 37(-1.55,1.8) 37(0,-1.8) 37(0,-0.6) 37(0,0.6) 37(0,1.8) 37(1.55,-1.8) 37(1.55,-0.6) 37(1.55,0.6) 37(1.55,1.8)
  rect 3.6x4.1 smd far side: 37(0,0)
  rect 3.6x4.1 smd: 37(0,0)
  rrect24% 1.394x1.059 on Top Paste: Un1(0.775,1.2) Un2(0.775,-1.2) Un3(-0.775,-1.2) Un4(-0.775,1.2) Un5(0.775,0) Un6(-0.775,0)
F.SilkS:
  lines w0.12: -2.61,-2.635 -2.61,-3.11 -2.135,-3.11 ; -2.61,3.11 -2.135,3.11 ; 2.135,-3.11 2.61,-3.11 2.61,-2.635 ; 2.135,3.11 2.61,3.11 2.61,2.635
F.CrtYd:
  lines w0.05: -3.12,-3.62 3.12,-3.62 3.12,3.62 -3.12,3.62 -3.12,-3.62
F.Fab:
  lines w0.1: -2.5,-3 2.5,-3 2.5,3 -1.5,3 -2.5,2 -2.5,-3
  text "'.Designator'" at -4.047,-0.84 h1